# Altium footprint library Footprints.PcbLib: 207 footprints (part 1 of 13)
Each footprint in its own frame and in the unit in brackets; x right, y up, seen from the top. Pads: shape width x height; smd on the part's side, far side on the other; paste and mask are expansions set on the pad; w line width, h text height; cw(c..) or ccw(c..) is an arc to the next point about the centre after c.
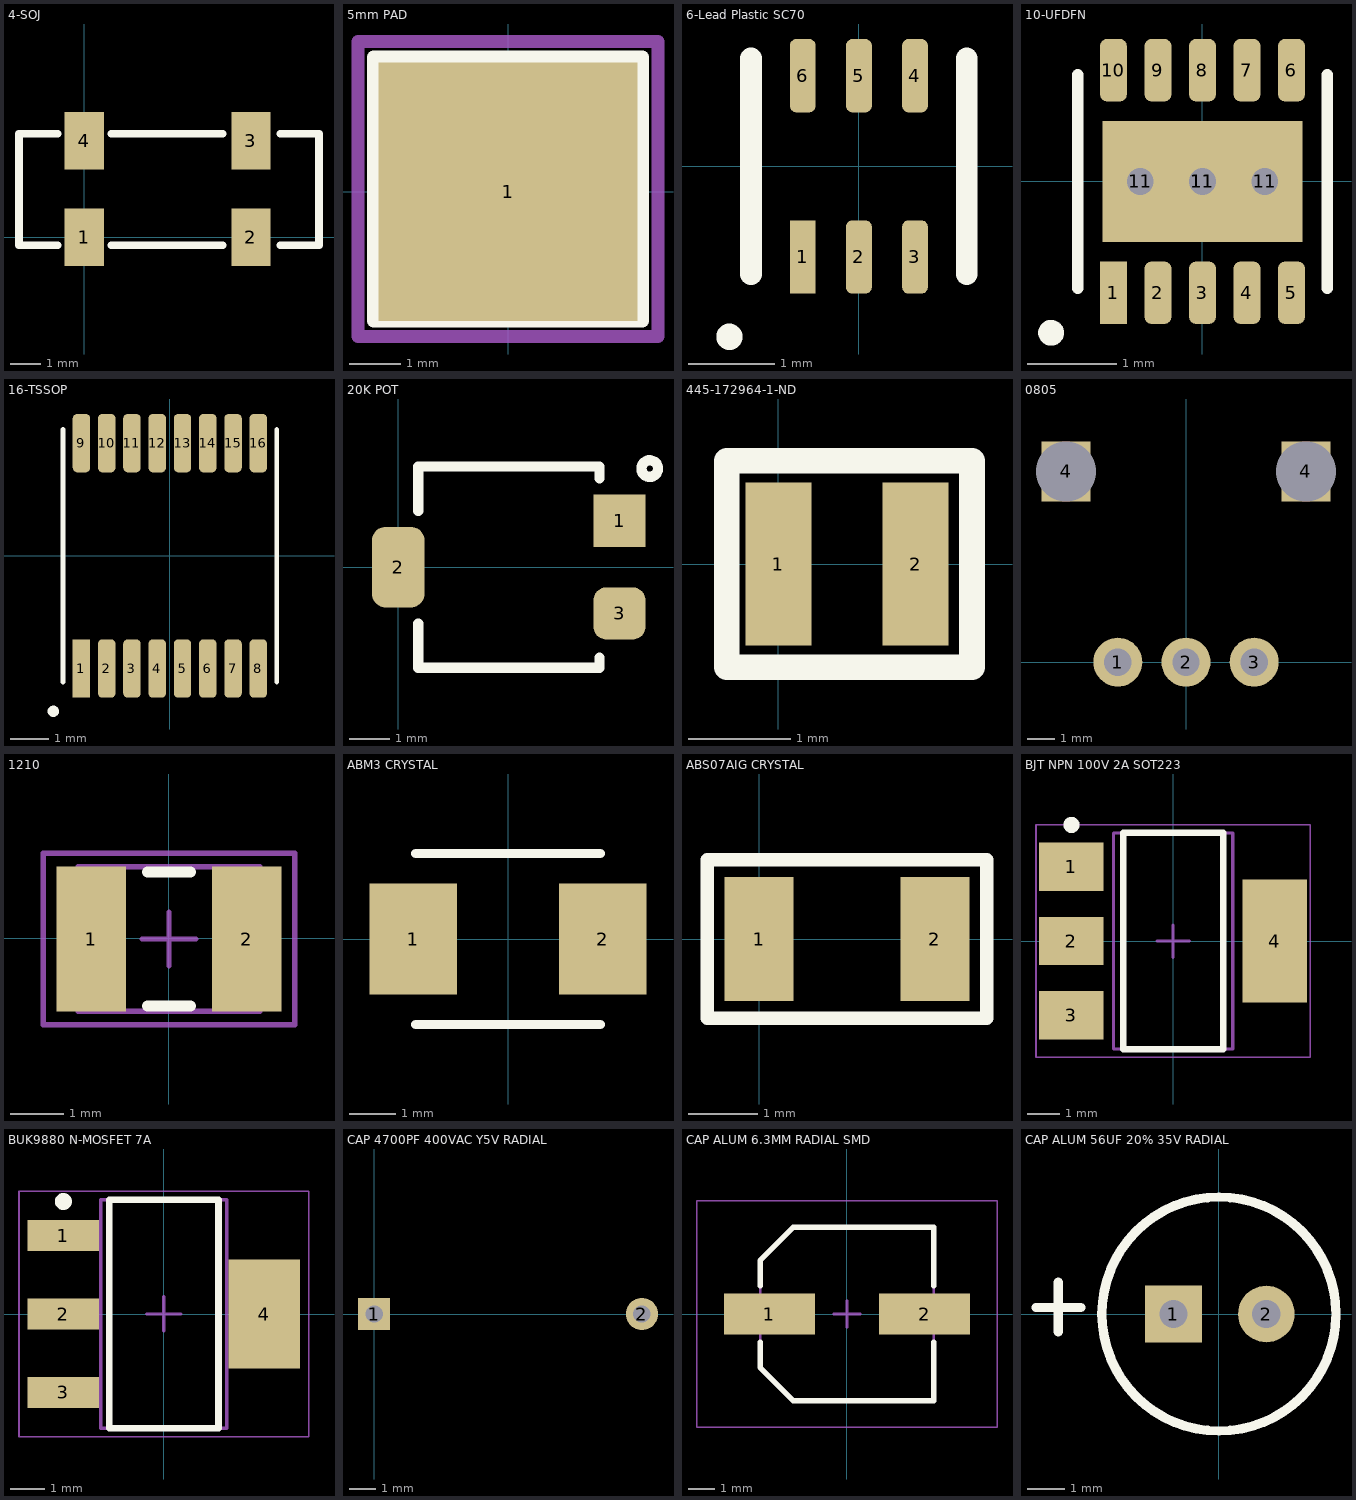
[diagram p0: the footprints below, top view; thin cyan lines are the x and y axes]

## 4-SOJ [mm]
pads (4):
  rect 1.3x1.9 smd: 1(0,0) 2(5.5,0) 3(5.5,3.2) 4(0,3.2)
Top Overlay:
  lines w0.254: -0.889,-0.254 -2.159,-0.254 -2.159,3.429 -0.889,3.429 ; 0.889,-0.254 4.572,-0.254 ; 0.889,3.429 4.572,3.429 ; 6.477,-0.254 7.747,-0.254 7.747,3.429 6.477,3.429

## 5mm PAD [mm] "5mmx5mm Pad for EMI GROUND"
pads (1):
  rect 5x5 smd: 1(0,0)
Top Overlay:
  lines w0.254: -2.6,-2.5 2.6,-2.5 2.6,2.6 -2.6,2.6 -2.6,-2.5
Mechanical 15:
  lines w0.254: -2.8,2.9 2.9,2.9 2.9,-2.8 -2.9,-2.8 -2.9,2.9 -2.6,2.9

## 6-Lead Plastic SC70 [mm]
pads (6):
  rect 0.3x0.85 smd: 1(-0.65,-1.05)
  rrect50% 0.3x0.85 smd: 2(0,-1.05) 3(0.65,-1.05) 4(0.65,1.05) 5(0,1.05) 6(-0.65,1.05)
Top Overlay:
  circle w0.254: c-1.5,-1.975 r0.025
  lines w0.254: -1.25,-1.25 -1.25,1.25 ; 1.25,-1.25 1.25,1.25
3D body "KS_6-M.step": height 1.09, standoff 0, extent -1.105,-1.194 1.105,1.194

## 10-UFDFN [mm]
pads (14):
  rect 0.3x0.7 smd: 1(-1,-1.25)
  rrect50% 0.3x0.7 smd: 2(-0.5,-1.25) 3(0,-1.25) 4(0.5,-1.25) 5(1,-1.25) 6(1,1.25) 7(0.5,1.25) 8(0,1.25) 9(-0.5,1.25) 10(-1,1.25)
  round 0.6 hole 0.3: 11(-0.7,0) 11(0,0) 11(0.7,0)
  rect 2.25x1.36 smd paste-0.2: 11(0,0)
Top Overlay:
  circle w0.15: c-1.7,-1.7 r0.07
  lines w0.127: -1.4,-1.2 -1.4,1.2 ; 1.4,-1.2 1.4,1.2
3D body: height 0.6, standoff 0, extent -1.275,-1.275 1.275,1.275

## 16-TSSOP [mm]
pads (16):
  rect 0.45x1.5 smd: 1(-2.275,-2.9)
  rrect50% 0.45x1.5 smd: 2(-1.625,-2.9) 3(-0.975,-2.9) 4(-0.325,-2.9) 5(0.325,-2.9) 6(0.975,-2.9) 7(1.625,-2.9) 8(2.275,-2.9) 9(-2.275,2.9) 10(-1.625,2.9) 11(-0.975,2.9) 12(-0.325,2.9) 13(0.325,2.9) 14(0.975,2.9) 15(1.625,2.9) 16(2.275,2.9)
Top Overlay:
  circle w0.15: c-3,-4 r0.07
  lines w0.127: -2.75,-3.25 -2.75,3.25 ; 2.75,-3.25 2.75,3.25
3D body "PW16.step": height 1.2, standoff 0, extent -2.553,-3.302 2.553,3.302

## 20K POT [mm]
height 2.7
pads (3):
  rect 1.3x1.3 smd: 1(5.5,1.15)
  rrect50% 1.3x2 smd: 2(0,0)
  rrect50% 1.3x1.3 smd: 3(5.5,-1.15)
Top Overlay:
  circle w0.254: c6.25,2.45 r0.206
  lines w0.254: 0.5,-1.4 0.5,-2.5 5,-2.5 5,-2.25 ; 0.5,1.4 0.5,2.5 5,2.5 5,2.2

## 445-172964-1-ND [mm]
pads (2):
  rect 0.65x1.6 smd: 1(0,0) 2(1.35,0)
Top Overlay:
  lines w0.254: -0.508,-1.016 1.905,-1.016 1.905,1.016 -0.508,1.016 -0.508,-1.016

## 0805 [mm]
pads (5):
  round 1.8 hole 1: 1(-2.5,0) 2(0,0) 3(2.5,0)
  rect 1.8x2.2 hole 2.2 square: 4(-4.4,7) 4(4.4,7)
3D body "ptv09a-4x15f-xxxx.stp": height 14.5, standoff -4.49, extent -5.7,-0.05 5.7,12.6

## 1210 [mm]
pads (2):
  rect 1.3x2.7 smd: 1(-1.441,-0.01) 2(1.459,-0.01)
Top Overlay:
  lines w0.2: -0.391,-1.26 0.409,-1.26 ; -0.391,1.24 0.409,1.24
Mechanical 13:
  lines w0.1: -1.691,-1.36 -1.691,1.34 1.709,1.34 1.709,-1.36 -1.691,-1.36
Mechanical 15:
  lines w0.1: -0.491,-0.01 0.509,-0.01 ; 0.009,-0.51 0.009,0.49 ; -2.341,-1.61 -2.341,1.59 2.359,1.59 2.359,-1.61 -2.341,-1.61
3D body: height 1.5, standoff 0, extent -1.691,-1.36 1.709,1.34

## ABM3 CRYSTAL [mm]
pads (2):
  rect 1.9x2.4 smd: 1(-2.05,0) 2(2.05,0)
Top Overlay:
  lines w0.2: -2,-1.85 2,-1.85 ; -2,1.85 2,1.85
3D body "ABM3.STEP": height 1.3, standoff 0, extent -2.5,-1.6 2.5,1.6

## ABS07AIG CRYSTAL [mm]
pads (2):
  rect 1x1.8 smd: 1(0,0) 2(2.55,0)
Top Overlay:
  lines w0.2: -0.75,-1.15 3.3,-1.15 3.3,1.15 -0.75,1.15 -0.75,-1.15
3D body "ABS07.STEP": height 0.89, standoff 0, extent -0.325,-0.749 2.875,0.749

## BJT NPN 100V 2A SOT223 [mm] "SOT223, 4-Leads, Body 6.50x7.00mm (avg), Pitch 2.30mm, IPC Medium Density"
height 1.75
pads (4):
  rect 2x1.5 smd: 1(-3.15,2.3) 2(-3.15,0) 3(-3.15,-2.3)
  rect 2x3.8 smd: 4(3.15,0)
Top Overlay:
  circle w0.25: c-3.15,3.6 r0.125
  lines w0.2: -1.55,-3.35 -1.55,3.35 1.55,3.35 1.55,-3.35 -1.55,-3.35
Mechanical 13:
  lines w0.1: -1.85,-3.35 -1.85,3.35 1.85,3.35 1.85,-3.35 -1.85,-3.35
Mechanical 15:
  lines w0.05: -4.25,-3.6 -4.25,3.6 4.25,3.6 4.25,-3.6 -4.25,-3.6
  lines w0.1: -0.5,0 0.5,0 ; 0,-0.5 0,0.5
3D body "BJT NPN 100V 2A SOT223.step": height 1.75, standoff 0, extent -3.5,-3.35 3.5,3.35

## BUK9880 N-MOSFET 7A [mm] "SOT223, 4-Leads, Body 6.50x7.00mm (avg), Pitch 2.30mm, IPC Medium Density"
height 1.8
pads (4):
  rect 2.1x0.9 smd: 1(-2.95,2.3) 2(-2.95,0) 3(-2.95,-2.3)
  rect 2.1x3.2 smd: 4(2.95,0)
Top Overlay:
  circle w0.25: c-2.95,3.3 r0.125
  lines w0.2: -1.6,-3.35 -1.6,3.35 1.6,3.35 1.6,-3.35 -1.6,-3.35
Mechanical 13:
  lines w0.1: -1.85,-3.35 -1.85,3.35 1.85,3.35 1.85,-3.35 -1.85,-3.35
Mechanical 15:
  lines w0.05: -4.25,-3.6 -4.25,3.6 4.25,3.6 4.25,-3.6 -4.25,-3.6
  lines w0.1: -0.5,0 0.5,0 ; 0,-0.5 0,0.5
3D body "SOT230P700X180-4N.step": height 1.8, standoff 0, extent -3.5,-3.35 3.5,3.35

## CAP 4700PF 400VAC Y5V RADIAL [mm] "4700pF ±20% 400VAC Ceramic Capacitor Y5V (F) Radial, Disc"
pads (2):
  rect 1.2x1.2 hole 0.65: 1(0,0)
  round 1.2 hole 0.65: 2(10,0)
3D body "C951U472MVVDBA7317.step": height 16, standoff -19.8, extent -1,-3 11,2.502

## CAP ALUM 6.3MM RADIAL SMD [mm] "Aluminum Electrolytic Capacitor, Body 6.50x6.50x5.50mm, IPC Low Density"
height 5.5
pads (2):
  rect 3.45x1.55 smd: 1(-2.95,0) 2(2.95,0)
Top Overlay:
  lines w0.2: -3.3,-1.075 -3.3,-2.037 -2.037,-3.3 3.3,-3.3 3.3,-1.075 ; -3.3,1.075 -3.3,2.037 -2.037,3.3 3.3,3.3 3.3,1.075
Mechanical 13:
  lines w0.1: -3.3,-2.037 -3.3,2.037 -2.037,3.3 3.3,3.3 3.3,-3.3 -2.037,-3.3 -3.3,-2.037
Mechanical 15:
  lines w0.05: -5.7,-4.3 5.7,-4.3 5.7,4.3 -5.7,4.3 -5.7,-4.3
  lines w0.1: -0.5,0 0.5,0 ; 0,-0.5 0,0.5
3D body "CAP 6.3MM RADIAL SMD.step": height 5.5, standoff -0.8, extent -3.9,-3.3 3.9,3.3

## CAP ALUM 56UF 20% 35V RADIAL [mil] "56µF 35V Aluminum Electrolytic Capacitors Radial, Can 1000 Hrs @ 105°C"
pads (2):
  rect 60x60 hole 30: 1(-48.23,0)
  round 60 hole 30: 2(50.2,0)
Top Overlay:
  circle w10: c0,0 r124.02
  lines w10: -193.9,6.89 -146.65,6.89 ; -170.28,-18.7 -170.28,33.46
3D body: height 440.94, standoff 0, extent -124.02,-123.89 124.02,123.89